# Altium footprint library LIBRARIE_EMILE.PcbLib: 35 footprints (part 2 of 3)
Each footprint in its own frame and in the unit in brackets; x right, y up, seen from the top. Pads: shape width x height; smd on the part's side, far side on the other; paste and mask are expansions set on the pad; w line width, h text height; cw(c..) or ccw(c..) is an arc to the next point about the centre after c.
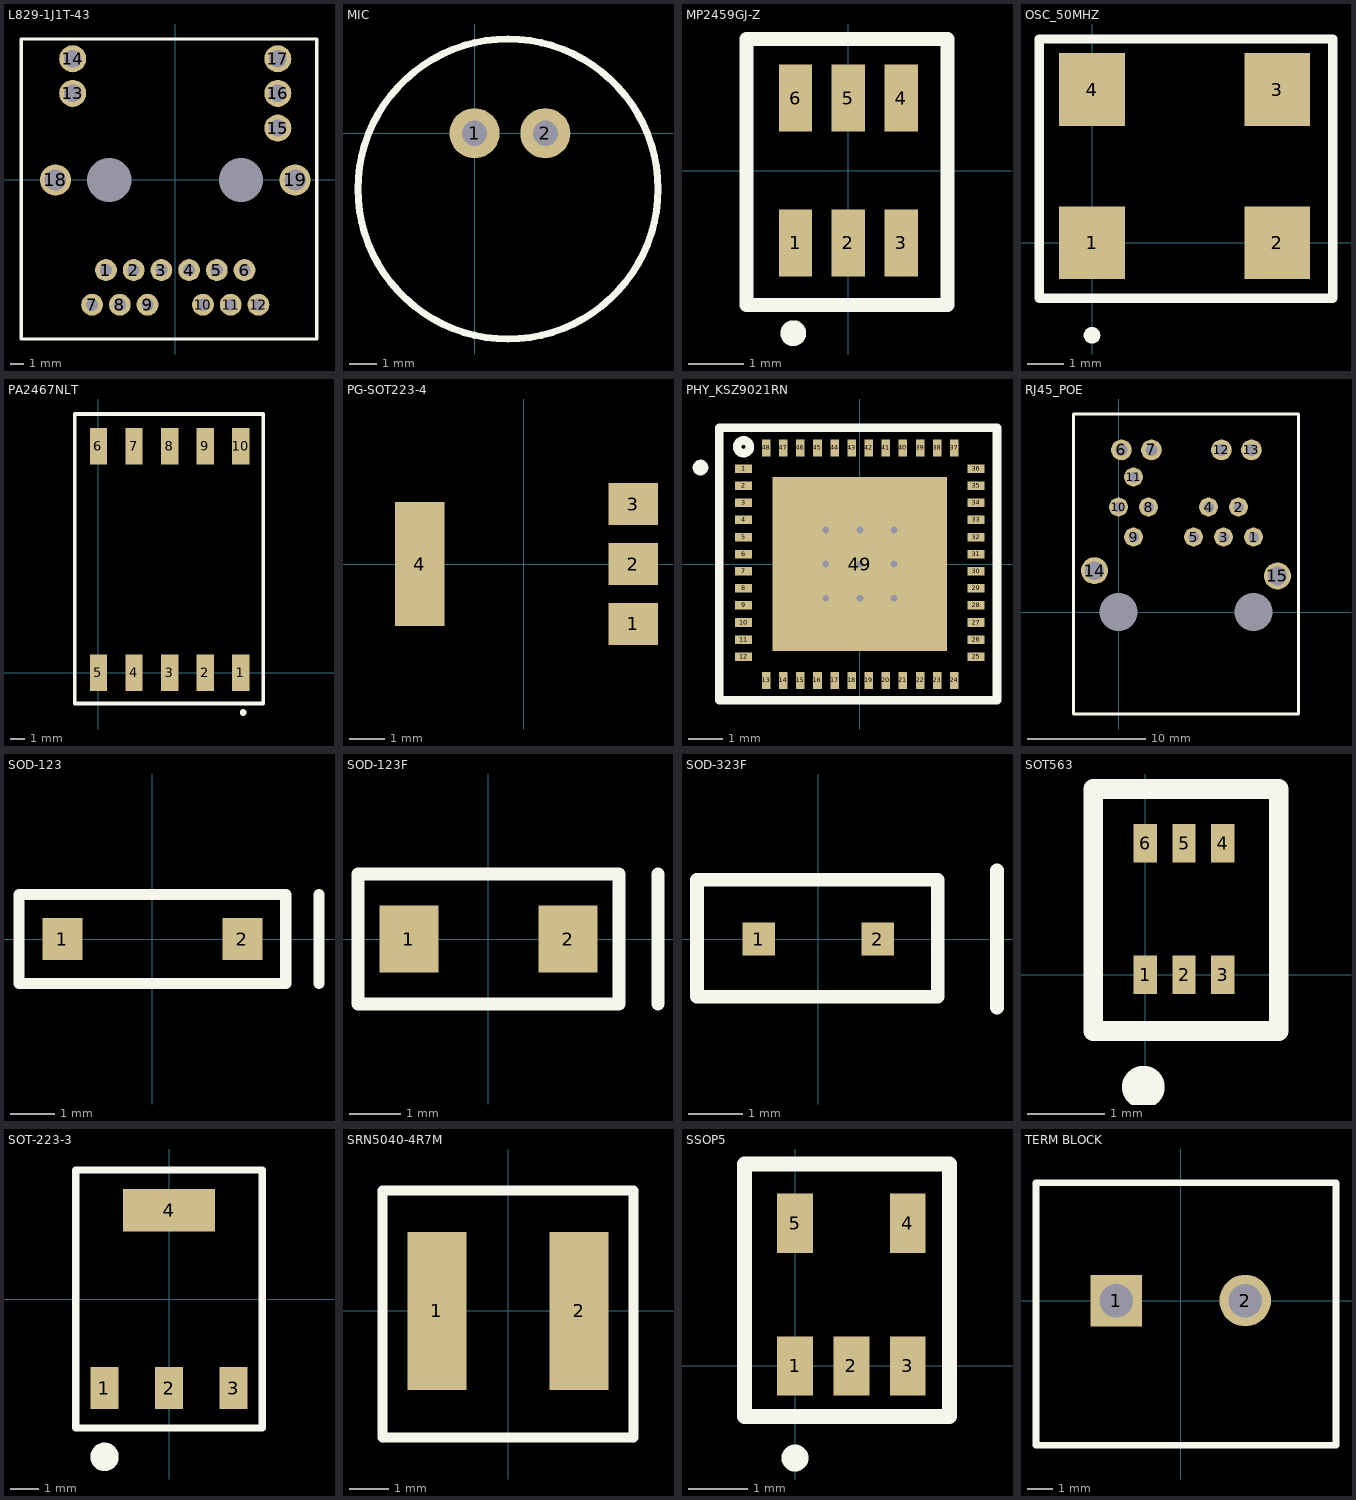
[diagram p1: the footprints below, top view; thin cyan lines are the x and y axes]

## L829-1J1T-43 [mil]
pads (21):
  round 63 hole 35 paste+0 mask+2.7: 1(-200,-260) 2(-120,-260) 3(-40,-260) 4(40,-260) 5(120,-260) 6(200,-260) 7(-240,-360) 8(-160,-360) 9(-80,-360) 10(80,-360) 11(160,-360) 12(240,-360)
  round 78 hole 50 paste+0 mask+2.7: 13(-296,250) 14(-296,350) 15(296,150) 16(296,250) 17(296,350)
  round 90 hole 62 paste+0 mask+2.7: 18(-346,0) 19(346,0)
  round 0 hole 128 paste+0 mask+2.7: ""(-190,0) ""(190,0)
Top Overlay:
  lines w10: 405,407 -444,407 -444,-459 408,-459 408,407
3D body "User Library-BEL FUSE L829-1J1T-43.step": height 493.09, standoff -151.5, extent -400.6,-424 400.6,543

## MIC [mm]
pads (2):
  round 1.8 hole 0.9 paste-0.025 mask+0.05: 1(0,0) 2(2.54,0)
Top Overlay:
  circle w0.254: c1.2,-2 r5.381
3D body "cmc-9745-44p.stp": height 5.2, standoff -4, extent -3.65,-6.9 6.05,2.8

## MP2459GJ-Z [mm]
pads (6):
  rect 0.6x1.2 smd paste-0.025 mask+0.07: 1(-0.95,-1.3) 2(0,-1.3) 3(0.95,-1.3) 4(0.95,1.3) 5(0,1.3) 6(-0.95,1.3)
Top Overlay:
  circle w0.254: c-0.991,-2.921 r0.105
  lines w0.254: -1.829,-2.413 -1.829,2.362 1.778,2.362 1.778,-2.413 -1.829,-2.413
3D body "User Library-TSOT-23.step": height 0.86, standoff 0, extent -1.5,-1.405 1.5,1.405

## OSC_50MHZ [mm]
pads (4):
  rect 1.8x2 smd paste-0.025 mask+0.05: 1(0,0) 2(5.08,0) 3(5.08,4.2) 4(0,4.2)
Top Overlay:
  circle w0.254: c0,-2.54 r0.1
  lines w0.254: -1.448,-1.524 6.604,-1.524 6.604,5.588 -1.448,5.588 -1.448,-1.524
3D body "User Library-ECS-3951.step": height 1.7, standoff 0, extent -0.934,-0.443 6.066,4.559

## PA2467NLT [mm]
pads (10):
  rect 1.22x2.54 smd paste-0.025 mask+0.07: 1(10,0) 2(7.5,0) 3(5,0) 4(2.5,0) 5(0,0) 6(0,15.9) 7(2.5,15.9) 8(5,15.9) 9(7.5,15.9) 10(10,15.9)
Top Overlay:
  circle w0.254: c10.16,-2.794 r0.105
  lines w0.254: -1.651,-2.159 11.557,-2.159 11.557,18.161 -1.651,18.161 -1.651,-2.159
3D body: height 12, standoff 0, extent -1.079,2.096 10.986,14.161

## PG-SOT223-4 [mm]
pads (4):
  rect 1.4x1.2 smd paste-0.025 mask+0.07: 1(3.1,-1.7) 2(3.1,0) 3(3.1,1.7)
  rect 1.4x3.5 smd paste-0.025 mask+0.07: 4(-2.95,0)

## PHY_KSZ9021RN [mm] "QFN, 48-Leads, Body 7,00x7,00mm, Pitch 0,50mm, Thermal Pad 5,10x5,10mm, IPC Medium Density"
height 0.9
pads (49):
  rect 0.5x0.25 smd mask+0.05: 1(-3.4,2.79) 2(-3.4,2.29) 3(-3.4,1.79) 4(-3.4,1.29) 5(-3.4,0.79) 6(-3.4,0.29) 7(-3.4,-0.21) 8(-3.4,-0.71) 9(-3.4,-1.21) 10(-3.4,-1.71) 11(-3.4,-2.21) 12(-3.4,-2.71) 25(3.4,-2.71) 26(3.4,-2.21) 27(3.4,-1.71) 28(3.4,-1.21) 29(3.4,-0.71) 30(3.4,-0.21) 31(3.4,0.29) 32(3.4,0.79) 33(3.4,1.29) 34(3.4,1.79) 35(3.4,2.29) 36(3.4,2.79)
  rect 0.25x0.5 smd mask+0.05: 13(-2.74,-3.4) 14(-2.24,-3.4) 15(-1.74,-3.4) 16(-1.24,-3.4) 17(-0.74,-3.4) 18(-0.24,-3.4) 19(0.26,-3.4) 20(0.76,-3.4) 21(1.26,-3.4) 22(1.76,-3.4) 23(2.26,-3.4) 24(2.76,-3.4) 37(2.76,3.4) 38(2.26,3.4) 39(1.76,3.4) 40(1.26,3.4) 41(0.76,3.4) 42(0.26,3.4) 43(-0.24,3.4) 44(-0.74,3.4) 45(-1.24,3.4) 46(-1.74,3.4) 47(-2.24,3.4) 48(-2.74,3.4)
  rect 5.1x5.1 smd mask+0.05: 49(0,0)
via -1,1 diameter 0.5 hole 0.2
via 0,1 diameter 0.5 hole 0.2
via 1,1 diameter 0.5 hole 0.2
via -1,0 diameter 0.5 hole 0.2
via 0,0 diameter 0.5 hole 0.2
via 1,0 diameter 0.5 hole 0.2
via -1,-1 diameter 0.5 hole 0.2
via 0,-1 diameter 0.5 hole 0.2
via 1,-1 diameter 0.5 hole 0.2
Top Overlay:
  circle w0.254: c-3.404,3.429 r0.186
  circle w0.254: c-4.663,2.823 r0.101
  lines w0.254: -4.11,-3.984 -4.11,3.987 4.01,3.987 4.01,-3.984 -4.11,-3.984
3D body: height 0.9, standoff 0, extent -3.525,-3.525 3.525,3.525

## RJ45_POE [mil]
pads (17):
  round 63 hole 35 paste+0 mask+2.7: 1(450,250) 2(400,350) 3(350,250) 4(300,350) 5(250,250) 8(100,350) 9(50,250) 10(0,350) 11(50,450)
  round 68.9 hole 40.16 paste+0 mask+2.7: 6(9.84,540.16) 7(109.84,540.16) 12(343.31,540.16) 13(443.31,540.16)
  round 90 hole 62 paste+0 mask+2.7: 14(-79.92,137.8) 15(529.92,120.08)
  round 0 hole 128 paste+0 mask+2.7: ""(0,0) ""(450,0)
Top Overlay:
  lines w10: -150,-340 -150,660 600,660 600,-340 -150,-340

## SOD-123 [mm]
pads (2):
  rect 0.9x0.95 smd paste-0.025 mask+0.07: 1(-2.025,0) 2(2.025,0)
Top Overlay:
  lines w0.254: 3.75,-1 3.75,1 ; -3,-1 -3,1 3,1 3,-1 -3,-1
3D body "SOD123.step": height 1.27, standoff 0, extent -1.85,-0.8 1.85,0.8

## SOD-123F [mm]
pads (2):
  rect 1.15x1.3 smd paste-0.025 mask+0.07: 1(-1.55,0) 2(1.55,0)
Top Overlay:
  lines w0.254: 3.302,-1.27 3.302,1.27 ; -2.54,-1.27 -2.54,1.27 2.54,1.27 2.54,-1.27 -2.54,-1.27
3D body "User Library-SOD123F.step": height 1.2, standoff -0.01, extent -1.85,-0.85 1.9,0.85

## SOD-323F [mm]
pads (2):
  rect 0.6x0.6 smd paste-0.025 mask+0.07: 1(-1.1,0) 2(1.1,0)
Top Overlay:
  lines w0.254: 3.302,-1.27 3.302,1.27 ; -2.235,-1.067 -2.235,1.092 2.21,1.092 2.21,-1.067 -2.235,-1.067
3D body "User Library-SOD-323F.STEP": height 0.79, standoff -0.08, extent -1.375,-0.613 1.325,0.737

## SOT563 [mm]
pads (6):
  rect 0.3x0.5 smd paste-0.025 mask+0.05: 1(0,0) 2(0.5,0) 3(1,0) 4(1,1.7) 5(0.5,1.7) 6(0,1.7)
Top Overlay:
  circle w0.5: c-0.025,-1.45 r0.025
  lines w0.254: -0.675,-0.725 1.725,-0.725 1.725,2.4 -0.675,2.4 -0.675,-0.725
3D body "User Library-SOT-563.step": height 0.58, standoff 0, extent -0.3,0.037 1.3,1.663

## SOT-223-3 [mil]
pads (4):
  rect 39x59 smd paste-0.98 mask+2.76: 1(-90,-124) 2(0,-124) 3(90,-124)
  rect 129x59 smd paste-0.98 mask+2.76: 4(0,124)
Top Overlay:
  circle w19.68: c-90,-220 r10
  lines w10: -130,-180 -130,180 130,180 130,-180 -130,-180
3D body "SOT-3_ST.step": height 71.1, standoff 0, extent -132.01,-143.5 132.01,143.5

## SRN5040-4R7M [mm] "inductor"
pads (2):
  rect 1.5x4 smd paste-0.025 mask+0.07: 1(-1.8,0) 2(1.8,0)
Top Overlay:
  lines w0.254: -3.175,-3.2 -3.175,3.048 3.175,3.048 3.175,-3.2 -3.175,-3.2
3D body "User Library-SRN5040.step": height 4, standoff 0, extent -2.5,-2.525 2.5,2.475

## SSOP5 [mm]
pads (5):
  rect 0.6x1 smd paste-0.025 mask+0.05: 1(0,0) 2(0.95,0) 3(1.9,0) 4(1.9,2.4) 5(0,2.4)
Top Overlay:
  circle w0.254: c0,-1.55 r0.1
  lines w0.254: -0.85,-0.85 2.6,-0.85 2.6,3.4 -0.85,3.4 -0.85,-0.85
3D body "29250.stp": height 1.12, standoff 0, extent -0.5,-0.1 2.4,2.7

## TERM BLOCK [mm]
pads (2):
  rect 2x2 hole 1.3 paste-0.025 mask+0.07: 1(-2.5,0)
  round 2 hole 1.3 paste-0.025 mask+0.07: 2(2.5,0)
Top Overlay:
  lines w0.254: -5.613,-5.613 6.02,-5.613 6.02,4.572 -5.613,4.572 -5.613,-5.613
3D body "1935161--3DModel-STEP-56544.STEP": height 11.7, standoff -3.2, extent -5.014,-5.036 5.386,3.964